# Altium footprint library LHAC-4XDSP2XV7-VP5_0226_3.PcbLib: 96 footprints (part 8 of 12) (continued)
## FFG1158 [mil] "FFG1158" (continued)
via -39.35,196.85 diameter 18 hole 10
via -157.45,196.85 diameter 18 hole 10
via -600.15,-1436.51 diameter 18 hole 10
via -600.15,-1475.87 diameter 18 hole 10
via -600.15,-1515.23 diameter 18 hole 10
via 324.81,-1200.35 diameter 18 hole 10
via 324.81,-1121.63 diameter 18 hole 10
via 324.81,-1160.99 diameter 18 hole 10
via 324.81,-1239.71 diameter 18 hole 10
via 324.81,-1436.51 diameter 18 hole 10
via 324.81,-1318.43 diameter 18 hole 10
via 324.81,-1357.79 diameter 18 hole 10
via 324.81,-1475.87 diameter 18 hole 10
via 324.81,-1397.15 diameter 18 hole 10
via 324.81,-1082.27 diameter 18 hole 10
via -314.95,-433.05 diameter 18 hole 10
via -508.46,-1723.26 diameter 18 hole 10
via -468.46,-1723.26 diameter 18 hole 10
via -157.45,-472.45 diameter 18 hole 10
via -78.75,-393.65 diameter 18 hole 10
via 0,-732.62 diameter 18 hole 10
via -157.55,-1101.91 diameter 18 hole 10
via -157.55,-1456.23 diameter 18 hole 10
via 157.5,-393.7 diameter 18 hole 10
via -118.05,236.15 diameter 18 hole 10
via -196.85,236.15 diameter 18 hole 10
via -39.35,314.95 diameter 18 hole 10
via -78.75,275.55 diameter 18 hole 10
via -78.75,157.45 diameter 18 hole 10
via -118.05,196.85 diameter 18 hole 10
via -78.75,314.95 diameter 18 hole 10
via -196.85,314.95 diameter 18 hole 10
via -78.75,236.15 diameter 18 hole 10
via -196.85,196.85 diameter 18 hole 10
via -275.55,-118.05 diameter 18 hole 10
via -275.6,-39.4 diameter 18 hole 10
via -236.15,-157.45 diameter 18 hole 10
via -236.15,-78.75 diameter 18 hole 10
via -236.15,39.35 diameter 18 hole 10
via -275.55,78.75 diameter 18 hole 10
via -236.15,118.05 diameter 18 hole 10
via -314.95,118.05 diameter 18 hole 10
via -314.95,-236.15 diameter 18 hole 10
via -275.55,-196.85 diameter 18 hole 10
via -275.6,-275.6 diameter 18 hole 10
via -236.15,-236.15 diameter 18 hole 10
via 118.05,118.05 diameter 18 hole 10
via 78.75,-118.05 diameter 18 hole 10
via 78.75,78.75 diameter 18 hole 10
via 39.4,39.4 diameter 18 hole 10
via -118.05,-118.05 diameter 18 hole 10
via -118.05,-39.35 diameter 18 hole 10
via -78.75,-78.75 diameter 18 hole 10
via 39.35,118.05 diameter 18 hole 10
via -78.75,39.35 diameter 18 hole 10
via -78.75,-157.45 diameter 18 hole 10
via 78.75,-39.35 diameter 18 hole 10
via -157.5,39.4 diameter 18 hole 10
via -39.35,78.75 diameter 18 hole 10
via -118.05,78.75 diameter 18 hole 10
via -196.85,78.75 diameter 18 hole 10
via -78.75,118.05 diameter 18 hole 10
via -157.45,118.05 diameter 18 hole 10
via 78.75,-275.55 diameter 18 hole 10
via 78.75,-196.85 diameter 18 hole 10
via -78.75,-236.15 diameter 18 hole 10
via -39.4,-275.6 diameter 18 hole 10
via 39.35,-236.15 diameter 18 hole 10
via -118.05,-275.55 diameter 18 hole 10
via -39.35,-196.85 diameter 18 hole 10
via -118.05,-196.85 diameter 18 hole 10
via 196.85,39.35 diameter 18 hole 10
via 275.6,39.4 diameter 18 hole 10
via 196.85,118.05 diameter 18 hole 10
via 314.95,78.75 diameter 18 hole 10
via 236.15,78.75 diameter 18 hole 10
via 275.55,-78.75 diameter 18 hole 10
via 275.6,-157.5 diameter 18 hole 10
via 196.85,-78.75 diameter 18 hole 10
via 236.15,-39.35 diameter 18 hole 10
via 196.85,-157.45 diameter 18 hole 10
via 236.15,-118.05 diameter 18 hole 10
via 275.55,118.05 diameter 18 hole 10
via 157.45,78.75 diameter 18 hole 10
via 236.15,-275.55 diameter 18 hole 10
via 275.55,-236.15 diameter 18 hole 10
via 196.85,-236.15 diameter 18 hole 10
via 314.95,-275.55 diameter 18 hole 10
via 236.15,-196.85 diameter 18 hole 10
via -629.85,472.45 diameter 18 hole 10
via 590.55,-78.75 diameter 18 hole 10
via 551.15,-78.75 diameter 18 hole 10
via -669.25,472.45 diameter 18 hole 10
via -629.85,551.15 diameter 18 hole 10
via 629.85,-196.85 diameter 18 hole 10
via 669.3,-39.4 diameter 18 hole 10
via 629.85,-118.05 diameter 18 hole 10
via 629.85,-39.35 diameter 18 hole 10
via 669.25,-196.85 diameter 18 hole 10
via 669.25,-118.05 diameter 18 hole 10
via -39.35,236.15 diameter 18 hole 10
via 78.75,354.25 diameter 18 hole 10
via -314.95,629.85 diameter 18 hole 10
via -354.25,669.25 diameter 18 hole 10
via 275.6,393.7 diameter 18 hole 10
via 118.05,590.55 diameter 18 hole 10
via 118.05,275.55 diameter 18 hole 10
via 118.05,157.45 diameter 18 hole 10
via 275.55,354.25 diameter 18 hole 10
via 157.5,275.6 diameter 18 hole 10
via -39.4,393.7 diameter 18 hole 10
via -314.95,590.55 diameter 18 hole 10
via 78.75,157.45 diameter 18 hole 10
via 39.35,236.15 diameter 18 hole 10
via 118.05,196.85 diameter 18 hole 10
via -39.35,590.55 diameter 18 hole 10
via 393.65,629.85 diameter 18 hole 10
via -78.75,433.05 diameter 18 hole 10
via -78.75,472.45 diameter 18 hole 10
via -196.85,393.65 diameter 18 hole 10
via -157.5,393.7 diameter 18 hole 10
via -354.25,590.55 diameter 18 hole 10
via -118.05,669.25 diameter 18 hole 10
via -196.85,669.25 diameter 18 hole 10
via -39.4,433.1 diameter 18 hole 10
via -236.15,629.85 diameter 18 hole 10
via -275.6,669.3 diameter 18 hole 10
via -157.5,669.3 diameter 18 hole 10
via -612.06,785.74 diameter 18 hole 10
via -629.85,511.75 diameter 18 hole 10
via -590.55,629.85 diameter 18 hole 10
via -629.85,669.25 diameter 18 hole 10
via -669.25,590.55 diameter 18 hole 10
via -669.25,511.75 diameter 18 hole 10
via -669.3,669.3 diameter 18 hole 10
via -669.25,196.85 diameter 18 hole 10
via -669.3,275.6 diameter 18 hole 10
via -669.3,433.1 diameter 18 hole 10
via -629.85,196.85 diameter 18 hole 10
via -590.55,472.45 diameter 18 hole 10
via -590.55,314.95 diameter 18 hole 10
via -629.85,354.25 diameter 18 hole 10
via -669.25,354.25 diameter 18 hole 10
via -590.55,-39.35 diameter 18 hole 10
via -669.25,118.05 diameter 18 hole 10
via -590.55,157.45 diameter 18 hole 10
via -629.85,39.35 diameter 18 hole 10
via -669.3,-157.5 diameter 18 hole 10
via -629.85,-157.45 diameter 18 hole 10
via -669.25,-78.75 diameter 18 hole 10
via -669.3,39.4 diameter 18 hole 10
via -590.55,-354.25 diameter 18 hole 10
via -669.25,-314.95 diameter 18 hole 10
via -669.25,-236.15 diameter 18 hole 10
via -590.55,-196.85 diameter 18 hole 10
via -629.85,-472.45 diameter 18 hole 10
via -669.3,-393.7 diameter 18 hole 10
via -669.25,-472.45 diameter 18 hole 10
via -590.55,-511.75 diameter 18 hole 10
via -629.85,-314.95 diameter 18 hole 10
via -669.25,-629.85 diameter 18 hole 10
via -590.55,-669.25 diameter 18 hole 10
via -629.85,-629.85 diameter 18 hole 10
via -669.3,-551.2 diameter 18 hole 10
via -238.46,785.74 diameter 18 hole 10
via -433.05,590.55 diameter 18 hole 10
via -472.45,669.25 diameter 18 hole 10
via -511.75,590.55 diameter 18 hole 10
via -433.1,551.2 diameter 18 hole 10
via -551.2,551.2 diameter 18 hole 10
via -275.55,590.55 diameter 18 hole 10
via -433.05,511.75 diameter 18 hole 10
via -433.1,669.3 diameter 18 hole 10
via -511.75,669.25 diameter 18 hole 10
via -433.05,629.85 diameter 18 hole 10
via -511.75,511.75 diameter 18 hole 10
via -393.7,551.2 diameter 18 hole 10
via -551.15,629.85 diameter 18 hole 10
via -433.05,314.95 diameter 18 hole 10
via -393.65,314.95 diameter 18 hole 10
via -551.15,472.45 diameter 18 hole 10
via -393.65,472.45 diameter 18 hole 10
via -511.75,275.55 diameter 18 hole 10
via -354.25,236.15 diameter 18 hole 10
via -354.25,354.25 diameter 18 hole 10
via -354.25,314.95 diameter 18 hole 10
via -393.7,393.7 diameter 18 hole 10
via -354.25,196.85 diameter 18 hole 10
via -354.25,472.45 diameter 18 hole 10
via -551.15,314.95 diameter 18 hole 10
via -433.1,393.7 diameter 18 hole 10
via -393.65,236.15 diameter 18 hole 10
via -433.05,236.15 diameter 18 hole 10
via -314.95,314.95 diameter 18 hole 10
via -511.75,433.05 diameter 18 hole 10
via -354.25,393.65 diameter 18 hole 10
via -354.25,275.55 diameter 18 hole 10
via -354.25,433.05 diameter 18 hole 10
via -551.15,236.15 diameter 18 hole 10
via -236.15,472.45 diameter 18 hole 10
via -551.2,393.7 diameter 18 hole 10
via -275.55,196.85 diameter 18 hole 10
via -511.75,354.25 diameter 18 hole 10
via -511.75,196.85 diameter 18 hole 10
via -511.75,118.05 diameter 18 hole 10
via -354.25,118.05 diameter 18 hole 10
via -393.7,157.5 diameter 18 hole 10
via -275.55,-78.75 diameter 18 hole 10
via -393.65,-118.05 diameter 18 hole 10
via -354.25,-157.45 diameter 18 hole 10
via -275.6,-157.5 diameter 18 hole 10
via -354.25,-118.05 diameter 18 hole 10
via -551.2,-39.4 diameter 18 hole 10
via -551.15,78.75 diameter 18 hole 10
via -511.75,-78.75 diameter 18 hole 10
via -433.05,78.75 diameter 18 hole 10
via -393.7,-39.4 diameter 18 hole 10
via -354.25,-39.35 diameter 18 hole 10
via -551.15,-118.05 diameter 18 hole 10
via -433.1,-39.4 diameter 18 hole 10
via -433.1,157.5 diameter 18 hole 10
via -354.25,157.45 diameter 18 hole 10
via -433.05,-118.05 diameter 18 hole 10
via -551.2,157.5 diameter 18 hole 10
via -511.75,-157.45 diameter 18 hole 10
via -511.75,39.35 diameter 18 hole 10
via -354.25,-78.75 diameter 18 hole 10
via -354.25,39.35 diameter 18 hole 10
via -393.65,78.75 diameter 18 hole 10
via -354.25,78.75 diameter 18 hole 10
via -236.15,-118.05 diameter 18 hole 10
via -275.6,39.4 diameter 18 hole 10
via -236.15,-39.35 diameter 18 hole 10
via -236.15,78.75 diameter 18 hole 10
via -354.25,-275.55 diameter 18 hole 10
via -236.15,-275.55 diameter 18 hole 10
via -551.15,-196.85 diameter 18 hole 10
via -196.85,-472.45 diameter 18 hole 10
via -314.95,-511.75 diameter 18 hole 10
via -433.1,-275.6 diameter 18 hole 10
via -354.25,-236.15 diameter 18 hole 10
via -393.7,-275.6 diameter 18 hole 10
via -551.2,-433.1 diameter 18 hole 10
via -551.15,-354.25 diameter 18 hole 10
via -511.75,-314.95 diameter 18 hole 10
via -511.75,-236.15 diameter 18 hole 10
via -551.2,-275.6 diameter 18 hole 10
via -314.95,-275.55 diameter 18 hole 10
via -393.65,-196.85 diameter 18 hole 10
via -236.15,-354.25 diameter 18 hole 10
via -511.75,-393.65 diameter 18 hole 10
via -433.05,-196.85 diameter 18 hole 10
via -236.15,-196.85 diameter 18 hole 10
via -354.25,-196.85 diameter 18 hole 10
via -511.75,-472.45 diameter 18 hole 10
via -551.15,-511.75 diameter 18 hole 10
via -433.05,-354.25 diameter 18 hole 10
via -433.1,-393.7 diameter 18 hole 10
via -393.65,-354.25 diameter 18 hole 10
via -433.05,-472.45 diameter 18 hole 10
via -393.7,-393.7 diameter 18 hole 10
via -354.25,-354.25 diameter 18 hole 10
via -354.25,-393.65 diameter 18 hole 10
via -393.7,-433.1 diameter 18 hole 10
via -354.25,-433.05 diameter 18 hole 10
via -433.1,-433.1 diameter 18 hole 10
via -354.25,-314.95 diameter 18 hole 10
via -433.05,-511.75 diameter 18 hole 10
via -433.1,-551.2 diameter 18 hole 10
via -551.2,-669.3 diameter 18 hole 10
via -551.15,-590.55 diameter 18 hole 10
via -511.75,-629.85 diameter 18 hole 10
via -433.05,-629.85 diameter 18 hole 10
via -511.75,-551.15 diameter 18 hole 10
via -393.7,-669.3 diameter 18 hole 10
via -433.1,-669.3 diameter 18 hole 10
via -275.55,-629.85 diameter 18 hole 10
via -433.05,-590.55 diameter 18 hole 10
via -502.15,-1121.63 diameter 18 hole 10
via -354.4,-1180.65 diameter 18 hole 10
via -315.03,-1180.65 diameter 18 hole 10
via -502.15,-1082.27 diameter 18 hole 10
via -502.15,-1042.91 diameter 18 hole 10
via -216.66,-1012.54 diameter 18 hole 10
via -275.66,-1220.02 diameter 18 hole 10
via -275.66,-1298.75 diameter 18 hole 10
via -275.66,-1338.12 diameter 18 hole 10
via -354.4,-1377.49 diameter 18 hole 10
via -236.29,-1298.75 diameter 18 hole 10
via -315.03,-1220.02 diameter 18 hole 10
via -315.03,-1298.75 diameter 18 hole 10
via -315.03,-1338.12 diameter 18 hole 10
via -315.03,-1377.49 diameter 18 hole 10
via -502.15,-1515.23 diameter 18 hole 10
via -502.15,-1436.51 diameter 18 hole 10
via -502.15,-1475.87 diameter 18 hole 10
via -216.66,-1545.5 diameter 18 hole 10
via -508.46,-1605.26 diameter 18 hole 10
via -468.46,-1605.26 diameter 18 hole 10
via -39.4,669.3 diameter 18 hole 10
via 39.4,551.2 diameter 18 hole 10
via -118.05,511.75 diameter 18 hole 10
via -157.45,629.85 diameter 18 hole 10
via 118.05,314.95 diameter 18 hole 10
via -157.45,236.15 diameter 18 hole 10
via -39.4,275.6 diameter 18 hole 10
via 78.75,433.05 diameter 18 hole 10
via -196.85,354.25 diameter 18 hole 10
via -78.75,393.65 diameter 18 hole 10
via -39.35,118.05 diameter 18 hole 10
via -196.85,-157.45 diameter 18 hole 10
via -118.05,39.35 diameter 18 hole 10
via 118.05,-118.05 diameter 18 hole 10
via -78.75,-118.05 diameter 18 hole 10
via -39.4,39.4 diameter 18 hole 10
via -157.5,-39.4 diameter 18 hole 10
via -196.85,-78.75 diameter 18 hole 10
via -118.05,-78.75 diameter 18 hole 10
via 78.75,39.35 diameter 18 hole 10
via 78.75,118.05 diameter 18 hole 10
via -118.05,118.05 diameter 18 hole 10
via 39.35,78.75 diameter 18 hole 10
via -157.45,78.75 diameter 18 hole 10
via -78.75,78.75 diameter 18 hole 10
via -157.45,-118.05 diameter 18 hole 10
via -78.75,-39.35 diameter 18 hole 10
via 39.4,157.5 diameter 18 hole 10
via 78.75,-157.45 diameter 18 hole 10
via -118.05,-157.45 diameter 18 hole 10
via 78.75,-78.75 diameter 18 hole 10
via -196.85,39.35 diameter 18 hole 10
via 118.05,78.75 diameter 18 hole 10
via 118.05,-39.35 diameter 18 hole 10
via -118.05,-314.95 diameter 18 hole 10
via -196.85,-236.15 diameter 18 hole 10
via -39.35,-236.15 diameter 18 hole 10
via -78.75,-196.85 diameter 18 hole 10
via 118.05,-511.75 diameter 18 hole 10
via 78.75,-236.15 diameter 18 hole 10
via 39.35,-196.85 diameter 18 hole 10
via 78.75,-393.65 diameter 18 hole 10
via -78.75,-433.05 diameter 18 hole 10
via -157.45,-196.85 diameter 18 hole 10
via -118.05,-236.15 diameter 18 hole 10
via 118.05,-275.55 diameter 18 hole 10
via 118.05,-196.85 diameter 18 hole 10
via -157.45,-590.55 diameter 18 hole 10
via 39.4,-669.3 diameter 18 hole 10
via -39.4,-551.2 diameter 18 hole 10
via 78.66,-1180.65 diameter 18 hole 10
via 39.29,-1180.65 diameter 18 hole 10
via -118.26,-979.36 diameter 18 hole 10
via -39.45,-1298.75 diameter 18 hole 10
via 78.66,-1377.49 diameter 18 hole 10
via 39.29,-1377.49 diameter 18 hole 10
via -0.08,-1220.02 diameter 18 hole 10
via 39.29,-1220.02 diameter 18 hole 10
via 39.29,-1298.75 diameter 18 hole 10
via -0.08,-1298.75 diameter 18 hole 10
via 39.29,-1338.12 diameter 18 hole 10
via -0.08,-1338.12 diameter 18 hole 10
via -157.55,-1298.75 diameter 18 hole 10
via -78.82,-1298.75 diameter 18 hole 10
via -196.92,-1298.75 diameter 18 hole 10
via -177.23,-1545.55 diameter 18 hole 10
via 433.05,629.85 diameter 18 hole 10
via 275.55,629.85 diameter 18 hole 10
via 157.45,590.55 diameter 18 hole 10
via 314.95,511.75 diameter 18 hole 10
via 433.05,590.55 diameter 18 hole 10
via 433.1,551.2 diameter 18 hole 10
via 433.05,511.75 diameter 18 hole 10
via 393.65,472.45 diameter 18 hole 10
via 393.7,669.3 diameter 18 hole 10
via 433.1,669.3 diameter 18 hole 10
via 354.25,236.15 diameter 18 hole 10
via 196.85,472.45 diameter 18 hole 10
via 236.15,354.25 diameter 18 hole 10
via 354.25,196.85 diameter 18 hole 10
via 354.25,354.25 diameter 18 hole 10
via 354.25,472.45 diameter 18 hole 10
via 393.65,314.95 diameter 18 hole 10
via 433.05,314.95 diameter 18 hole 10
via 393.7,393.7 diameter 18 hole 10
via 393.65,236.15 diameter 18 hole 10
via 433.05,236.15 diameter 18 hole 10
via 433.1,393.7 diameter 18 hole 10
via 354.25,433.05 diameter 18 hole 10
via 157.45,196.85 diameter 18 hole 10
via 433.05,472.45 diameter 18 hole 10
via 275.55,236.15 diameter 18 hole 10
via 354.25,275.55 diameter 18 hole 10
via 354.25,393.65 diameter 18 hole 10
via 354.25,314.95 diameter 18 hole 10
via 393.7,157.5 diameter 18 hole 10
via 433.1,157.5 diameter 18 hole 10
via 433.1,-39.4 diameter 18 hole 10
via 354.25,118.05 diameter 18 hole 10
via 196.85,-39.35 diameter 18 hole 10
via 157.5,39.4 diameter 18 hole 10
via 236.15,-157.45 diameter 18 hole 10
via 354.25,39.35 diameter 18 hole 10
via 157.5,-157.5 diameter 18 hole 10
via 354.25,-157.45 diameter 18 hole 10
via 275.55,78.75 diameter 18 hole 10
via 354.25,-78.75 diameter 18 hole 10
via 354.25,-118.05 diameter 18 hole 10
via 393.7,-39.4 diameter 18 hole 10
via 196.85,-118.05 diameter 18 hole 10
via 354.25,157.45 diameter 18 hole 10
via 236.15,39.35 diameter 18 hole 10
via 275.55,-118.05 diameter 18 hole 10
via 393.65,-118.05 diameter 18 hole 10
via 157.45,118.05 diameter 18 hole 10
via 393.65,78.75 diameter 18 hole 10
via 275.6,-39.4 diameter 18 hole 10
via 433.05,78.75 diameter 18 hole 10
via 433.05,-118.05 diameter 18 hole 10
via 196.85,78.75 diameter 18 hole 10
via 354.25,78.75 diameter 18 hole 10
via 354.25,-39.35 diameter 18 hole 10
via 157.45,-78.75 diameter 18 hole 10
via 236.15,-78.75 diameter 18 hole 10
via 314.95,-314.95 diameter 18 hole 10
via 196.85,-275.55 diameter 18 hole 10
via 433.05,-196.85 diameter 18 hole 10
via 354.25,-354.25 diameter 18 hole 10
via 196.85,-196.85 diameter 18 hole 10
via 236.15,-236.15 diameter 18 hole 10
via 354.25,-393.65 diameter 18 hole 10
via 354.25,-314.95 diameter 18 hole 10
via 354.25,-275.55 diameter 18 hole 10
via 275.6,-275.6 diameter 18 hole 10
via 196.85,-354.25 diameter 18 hole 10
via 354.25,-196.85 diameter 18 hole 10
via 275.55,-196.85 diameter 18 hole 10
via 314.95,-236.15 diameter 18 hole 10
via 393.7,-275.6 diameter 18 hole 10
via 433.1,-275.6 diameter 18 hole 10
via 354.25,-236.15 diameter 18 hole 10
via 393.65,-196.85 diameter 18 hole 10
via 157.45,-236.15 diameter 18 hole 10
via 354.25,-433.05 diameter 18 hole 10
via 236.15,-472.45 diameter 18 hole 10
via 393.65,-354.25 diameter 18 hole 10
via 433.1,-393.7 diameter 18 hole 10
via 393.7,-433.1 diameter 18 hole 10
via 433.05,-472.45 diameter 18 hole 10
via 433.05,-354.25 diameter 18 hole 10
via 433.05,-511.75 diameter 18 hole 10
via 433.1,-433.1 diameter 18 hole 10
via 157.45,-629.85 diameter 18 hole 10
via 433.1,-669.3 diameter 18 hole 10
via 433.05,-629.85 diameter 18 hole 10
via 393.7,-551.2 diameter 18 hole 10
via 433.05,-590.55 diameter 18 hole 10
via 433.1,-551.2 diameter 18 hole 10
via 275.55,-590.55 diameter 18 hole 10
via 422.81,-1200.35 diameter 18 hole 10
via 422.81,-1121.63 diameter 18 hole 10
via 422.81,-1160.99 diameter 18 hole 10
via 422.81,-1082.27 diameter 18 hole 10
via 422.81,-1239.71 diameter 18 hole 10
via 422.81,-1436.51 diameter 18 hole 10
via 422.81,-1357.79 diameter 18 hole 10
via 422.81,-1318.43 diameter 18 hole 10
via 422.81,-1475.87 diameter 18 hole 10
via 422.81,-1397.15 diameter 18 hole 10
via 551.2,551.2 diameter 18 hole 10
via 669.25,590.55 diameter 18 hole 10
via 472.45,669.25 diameter 18 hole 10
via 669.25,511.75 diameter 18 hole 10
via 511.75,669.25 diameter 18 hole 10
via 590.55,629.85 diameter 18 hole 10
via 629.85,511.75 diameter 18 hole 10
via 669.3,669.3 diameter 18 hole 10
via 511.75,590.55 diameter 18 hole 10
via 551.15,629.85 diameter 18 hole 10
via 511.75,511.75 diameter 18 hole 10
via 629.85,669.25 diameter 18 hole 10
via 629.85,354.25 diameter 18 hole 10
via 590.55,314.95 diameter 18 hole 10
via 551.15,314.95 diameter 18 hole 10
via 669.3,433.1 diameter 18 hole 10
via 669.25,354.25 diameter 18 hole 10
via 669.3,275.6 diameter 18 hole 10
via 511.75,275.55 diameter 18 hole 10
via 551.15,472.45 diameter 18 hole 10
via 629.85,196.85 diameter 18 hole 10
via 551.15,236.15 diameter 18 hole 10
via 511.75,196.85 diameter 18 hole 10
via 590.55,472.45 diameter 18 hole 10
via 511.75,433.05 diameter 18 hole 10
via 551.2,393.7 diameter 18 hole 10
via 511.75,354.25 diameter 18 hole 10
via 669.25,196.85 diameter 18 hole 10
via 629.85,39.35 diameter 18 hole 10
via 511.75,-157.45 diameter 18 hole 10
via 551.15,78.75 diameter 18 hole 10
via 669.3,39.4 diameter 18 hole 10
via 511.75,-78.75 diameter 18 hole 10
via 669.25,-78.75 diameter 18 hole 10
via 590.55,-39.35 diameter 18 hole 10
via 511.75,39.35 diameter 18 hole 10
via 551.2,157.5 diameter 18 hole 10
via 590.55,157.45 diameter 18 hole 10
via 511.75,118.05 diameter 18 hole 10
via 551.2,-39.4 diameter 18 hole 10
via 551.15,-118.05 diameter 18 hole 10
via 669.3,-157.5 diameter 18 hole 10
via 629.85,-157.45 diameter 18 hole 10
via 669.25,118.05 diameter 18 hole 10
via 551.15,-511.75 diameter 18 hole 10
via 551.15,-196.85 diameter 18 hole 10
via 590.55,-196.85 diameter 18 hole 10
via 511.75,-236.15 diameter 18 hole 10
via 590.55,-511.75 diameter 18 hole 10
via 669.25,-472.45 diameter 18 hole 10
via 590.55,-354.25 diameter 18 hole 10
via 511.75,-314.95 diameter 18 hole 10
via 551.2,-433.1 diameter 18 hole 10
via 669.3,-393.7 diameter 18 hole 10
via 511.75,-393.65 diameter 18 hole 10
via 551.15,-354.25 diameter 18 hole 10
via 669.25,-314.95 diameter 18 hole 10
via 669.25,-236.15 diameter 18 hole 10
via 629.85,-314.95 diameter 18 hole 10
via 629.85,-472.45 diameter 18 hole 10
via 511.75,-472.45 diameter 18 hole 10
via 590.55,-669.25 diameter 18 hole 10
via 669.3,-551.2 diameter 18 hole 10
via 551.15,-590.55 diameter 18 hole 10
via 511.75,-629.85 diameter 18 hole 10
via 511.75,-551.15 diameter 18 hole 10
via 669.25,-629.85 diameter 18 hole 10
via 551.2,-669.3 diameter 18 hole 10
via 629.85,-629.85 diameter 18 hole 10
Top Layer:
  lines w4: -669.3,157.5 -649.6,137.8 ; -669.3,393.7 -649.6,374 ; -669.3,551.2 -649.6,531.5 ; -669.25,78.75 -649.6,59.1 ; -669.25,236.15 -649.6,216.5 ; -669.25,314.95 -649.6,295.3 ; -669.25,472.45 -649.6,452.8 ; -669.25,629.85 -649.6,610.2 ; -629.85,78.75 -610.2,59.1 ; -629.85,157.45 -610.2,137.8 ; -629.85,236.15 -610.2,216.5 ; -629.85,314.95 -610.2,295.3 ; -629.85,393.65 -610.2,374 ; -629.85,472.45 -610.2,452.8 ; -629.85,551.15 -610.2,531.5 ; -629.85,629.85 -610.2,610.2 ; -590.55,-551.15 -570.9,-531.5 ; -590.55,-393.65 -570.9,-374 ; -590.55,-314.95 -570.9,-295.3 ; -590.55,-236.15 -570.9,-216.5 ; -590.55,-157.45 -570.9,-137.8 ; -590.55,39.35 -570.9,19.7 ; -590.55,118.05 -570.9,98.4 ; -590.55,196.85 -570.9,177.2 ; -590.55,275.55 -570.9,255.9 ; -590.55,354.25 -570.9,334.6 ; -590.55,433.05 -570.9,413.4 ; -590.55,669.25 -570.9,649.6 ; -551.2,-551.2 -531.5,-531.5 ; -551.2,-393.7 -531.5,-374 ; -551.2,-157.5 -531.5,-137.8 ; -551.2,39.4 -531.5,19.7 ; -551.2,275.6 -531.5,255.9 ; -551.2,433.1 -531.5,413.4 ; -551.2,669.3 -531.5,649.6 ; -551.15,-314.95 -531.5,-295.3 ; -551.15,-236.15 -531.5,-216.5 ; -551.15,118.05 -531.5,98.4 ; -551.15,196.85 -531.5,177.2 ; -551.15,354.25 -531.5,334.6 ; -511.75,-669.25 -492.1,-649.6 ; -511.75,-590.55 -492.1,-570.9 ; -511.75,-511.75 -492.1,-492.1 ; -511.75,-433.05 -492.1,-413.4 ; -511.75,-354.25 -492.1,-334.6 ; -511.75,-275.55 -492.1,-255.9 ; -511.75,-196.85 -492.1,-177.2 ; -511.75,-118.05 -492.1,-98.4 ; -511.75,-39.35 -492.1,-19.7 ; -511.75,78.75 -492.1,59.1 ; -511.75,157.45 -492.1,137.8 ; -511.75,236.15 -492.1,216.5 ; -511.75,314.95 -492.1,295.3 ; -511.75,393.65 -492.1,374 ; -511.75,472.45 -492.1,452.8 ; -472.45,-669.25 -452.8,-649.6 ; -472.45,-590.55 -452.8,-570.9 ; -472.45,-511.75 -452.8,-492.1 ; -472.45,-433.05 -452.8,-413.4 ; -472.45,-354.25 -452.8,-334.6 ; -472.45,-275.55 -452.8,-255.9 ; -472.45,-196.85 -452.8,-177.2 ; -472.45,-118.05 -452.8,-98.4 ; -472.45,-39.35 -452.8,-19.7 ; -472.45,78.75 -452.8,59.1 ; -472.45,157.45 -452.8,137.8 ; -472.45,314.95 -452.8,295.3 ; -472.45,393.65 -452.8,374 ; -472.45,472.45 -452.8,452.8 ; -433.1,433.1 -413.4,413.4 ; -433.05,-78.75 -413.4,-59.1 ; -433.05,118.05 -413.4,98.4 ; -433.05,354.25 -413.4,334.6 ; -393.7,-551.2 -374,-531.5 ; -393.65,-629.85 -374,-610.2 ; -393.65,-590.55 -374,-570.9 ; -393.65,-511.75 -374,-492.1 ; -393.65,-78.75 -374,-59.1 ; -393.65,118.05 -374,98.4 ; -393.65,354.25 -374,334.6 ; -354.25,-669.25 -334.6,-649.6 ; -354.25,-629.85 -334.6,-610.2 ; -354.25,-551.15 -334.6,-531.5 ; -354.25,-511.75 -334.6,-492.1 ; -354.25,-472.45 -334.6,-452.8 ; -314.95,-669.25 -295.3,-649.6 ; -314.95,-629.85 -295.3,-610.2 ; -314.95,-590.55 -295.3,-570.9 ; -314.95,-551.15 -295.3,-531.5 ; -314.95,-472.45 -295.3,-452.8 ; -314.95,-393.65 -295.3,-374 ; -314.95,-354.25 -295.3,-334.6 ; -314.95,-196.85 -295.3,-177.2 ; -314.95,-157.45 -295.3,-137.8 ; -314.95,-118.05 -295.3,-98.4 ; -314.95,-78.75 -295.3,-59.1 ; -314.95,-39.35 -295.3,-19.7 ; -314.95,39.35 -295.3,19.7 ; -314.95,78.75 -295.3,59.1 ; -314.95,433.05 -295.3,413.4 ; -314.95,472.45 -295.3,452.8 ; -275.6,-669.3 -255.9,-649.6 ; -275.6,-551.2 -255.9,-531.5 ; -275.6,-393.7 -255.9,-374 ; -275.55,-511.75 -255.9,-492.1 ; -275.55,-472.45 -255.9,-452.8 ; -275.55,-354.25 -255.9,-334.6 ; -275.55,-314.95 -255.9,-295.3 ; -275.55,118.05 -255.9,98.4 ; -236.15,-669.25 -216.5,-649.6 ; -236.15,-629.85 -216.5,-610.2 ; -236.15,-590.55 -216.5,-570.9 ; -236.15,-433.05 -216.5,-413.4 ; -236.15,-393.65 -216.5,-374 ; -236.15,-314.95 -216.5,-295.3 ; -236.15,511.75 -216.5,492.1 ; -196.85,-629.85 -177.2,-610.2 ; -196.85,-590.55 -177.2,-570.9 ; -196.85,-551.15 -177.2,-531.5 ; -196.85,-511.75 -177.2,-492.1 ; -196.85,-433.05 -177.2,-413.4 ; -196.85,-393.65 -177.2,-374 ; -196.85,-354.25 -177.2,-334.6 ; -196.85,-314.95 -177.2,-295.3 ; -196.85,118.05 -177.2,98.4 ; -196.85,393.65 -177.2,374 ; -157.5,-669.3 -137.8,-649.6 ; -157.5,-551.2 -137.8,-531.5 ; -157.5,-433.1 -137.8,-413.4 ; -157.5,-275.6 -137.8,-255.9 ; -157.5,393.7 -137.8,374 ; -157.45,-629.85 -137.8,-610.2 ; -157.45,-511.75 -137.8,-492.1 ; -157.45,-354.25 -137.8,-334.6 ; -157.45,-314.95 -137.8,-295.3 ; -157.45,472.45 -137.8,452.8 ; -118.05,-669.25 -98.4,-649.6 ; -118.05,-629.85 -98.4,-610.2 ; -118.05,-590.55 -98.4,-570.9 ; -118.05,-551.15 -98.4,-531.5 ; -118.05,-472.45 -98.4,-452.8 ; -118.05,-433.05 -98.4,-413.4 ; -118.05,-393.65 -98.4,-374 ; -118.05,-354.25 -98.4,-334.6 ; -118.05,433.05 -98.4,413.4 ; -118.05,472.45 -98.4,452.8 ; -78.75,-669.25 -59.1,-649.6 ; -78.75,-590.55 -59.1,-570.9 ; -78.75,-551.15 -59.1,-531.5 ; -78.75,-511.75 -59.1,-492.1 ; -78.75,-472.45 -59.1,-452.8 ; -78.75,-354.25 -59.1,-334.6 ; -78.75,-314.95 -59.1,-295.3 ; -78.75,-275.55 -59.1,-255.9 ; -39.4,-669.3 -19.7,-649.6 ; -39.4,-433.1 -19.7,-413.4 ; -39.4,-393.7 -19.7,-374 ; -39.4,-157.5 -19.7,-137.8 ; -39.4,-39.4 -19.7,-19.7 ; -39.4,157.5 -19.7,137.8 ; -39.35,-629.85 -19.7,-610.2 ; -39.35,-590.55 -19.7,-570.9 ; -39.35,-511.75 -19.7,-492.1 ; -39.35,-472.45 -19.7,-452.8 ; -39.35,-314.95 -19.7,-295.3 ; -39.35,-118.05 -19.7,-98.4 ; -39.35,-78.75 -19.7,-59.1 ; -39.35,354.25 -19.7,334.6 ; 19.7,-610.2 39.35,-629.85 ; 19.7,-570.9 39.35,-590.55 ; 19.7,-531.5 39.4,-551.2 ; 19.7,-492.1 39.35,-511.75 ; 19.7,-413.4 39.4,-433.1 ; 19.7,-374 39.4,-393.7 ; 19.7,-334.6 39.35,-354.25 ; 19.7,-295.3 39.35,-314.95 ; 19.7,-255.9 39.4,-275.6 ; 19.7,-137.8 39.4,-157.5 ; 19.7,-98.4 39.35,-118.05 ; 19.7,-59.1 39.35,-78.75 ; 19.7,-19.7 39.4,-39.4 ; 59.1,-649.6 78.75,-669.25 ; 59.1,-610.2 78.75,-629.85 ; 59.1,-531.5 78.75,-551.15 ; 59.1,-492.1 78.75,-511.75 ; 59.1,-452.8 78.75,-472.45 ; 59.1,-413.4 78.75,-433.05 ; 59.1,-334.6 78.75,-354.25 ; 59.1,-295.3 78.75,-314.95 ; 98.4,-649.6 118.05,-669.25 ; 98.4,-610.2 118.05,-629.85 ; 98.4,-570.9 118.05,-590.55 ; 98.4,-531.5 118.05,-551.15 ; 98.4,-452.8 118.05,-472.45 ; 98.4,-413.4 118.05,-433.05 ; 98.4,-374 118.05,-393.65 ; 98.4,-334.6 118.05,-354.25 ; 98.4,374 118.05,393.65 ; 98.4,413.4 118.05,433.05 ; 98.4,452.8 99.2,452.8 118.05,471.65 118.05,472.45 ; 137.8,-649.6 157.5,-669.3 ; 137.8,-570.9 157.45,-590.55 ; 137.8,-531.5 157.5,-551.2 ; 137.8,-492.1 157.45,-511.75 ; 137.8,-452.8 157.45,-472.45 ; 137.8,-295.3 157.45,-314.95 ; 137.8,137.8 157.5,157.5 ; 137.8,295.3 157.45,314.95 ; 137.8,452.8 157.45,472.45 ; 177.2,-649.6 196.85,-669.25 ; 177.2,-610.2 196.85,-629.85 ; 177.2,-570.9 196.85,-590.55 ; 177.2,-492.1 196.85,-511.75 ; 177.2,-452.8 196.85,-472.45 ; 177.2,-295.3 196.85,-314.95 ; 216.5,-610.2 236.15,-629.85 ; 216.5,-570.9 236.15,-590.55 ; 216.5,-531.5 236.15,-551.15 ; 216.5,-492.1 236.15,-511.75 ; 216.5,98.4 236.15,118.05 ; 255.9,-649.6 275.6,-669.3 ; 255.9,-610.2 275.55,-629.85 ; 255.9,-531.5 275.6,-551.2 ; 255.9,-492.1 275.55,-511.75 ; 255.9,334.6 275.55,354.25 ; 255.9,374 275.6,393.7 ; 255.9,570.9 275.55,590.55 ; 295.3,-649.6 314.95,-669.25 ; 295.3,-610.2 314.95,-629.85 ; 295.3,-570.9 314.95,-590.55 ; 295.3,-531.5 314.95,-551.15 ; 295.3,-452.8 314.95,-472.45 ; 295.3,-413.4 314.95,-433.05 ; 295.3,-177.2 314.95,-196.85 ; 295.3,-137.8 314.95,-157.45 ; 295.3,-98.4 314.95,-118.05 ; 295.3,-59.1 314.95,-78.75 ; 295.3,-19.7 314.95,-39.35 ; 295.3,19.7 314.95,39.35 ; 295.3,98.4 314.95,118.05 ; 334.6,-649.6 354.25,-669.25 ; 334.6,-570.9 354.25,-590.55 ; 334.6,-531.5 354.25,-551.15 ; 374,-649.6 393.7,-669.3 ; 374,-610.2 393.65,-629.85 ; 374,-570.9 393.65,-590.55 ; 374,-59.1 393.65,-78.75 ; 374,98.4 393.65,118.05 ; 413.4,-59.1 433.05,-78.75 ; 413.4,98.4 433.05,118.05 ; 413.4,413.4 433.1,433.1 ; 452.8,-649.6 472.45,-669.25 ; 452.8,-570.9 472.45,-590.55 ; 452.8,-492.1 472.45,-511.75 ; 452.8,-413.4 472.45,-433.05 ; 452.8,-334.6 472.45,-354.25 ; 452.8,-255.9 472.45,-275.55 ; 452.8,-177.2 472.45,-196.85 ; 452.8,-98.4 472.45,-118.05 ; 452.8,-19.7 472.45,-39.35 ; 452.8,59.1 472.45,78.75 ; 452.8,137.8 472.45,157.45 ; 452.8,216.5 472.45,236.15 ; 452.8,295.3 472.45,314.95 ; 452.8,374 472.45,393.65 ; 452.8,452.8 472.45,472.45 ; 492.1,-649.6 511.75,-669.25 ; 492.1,-570.9 511.75,-590.55 ; 492.1,-492.1 511.75,-511.75 ; 492.1,-413.4 511.75,-433.05 ; 492.1,-334.6 511.75,-354.25 ; 492.1,-255.9 511.75,-275.55 ; 492.1,-177.2 511.75,-196.85 ; 492.1,-98.4 511.75,-118.05 ; 492.1,-19.7 511.75,-39.35 ; 492.1,59.1 511.75,78.75 ; 492.1,137.8 511.75,157.45 ; 492.1,216.5 511.75,236.15 ; 492.1,295.3 511.75,314.95 ; 492.1,374 511.75,393.65 ; 492.1,452.8 511.75,472.45 ; 531.5,-531.5 551.2,-551.2 ; 531.5,-374 551.2,-393.7 ; 531.5,-295.3 551.15,-314.95 ; 531.5,-216.5 551.15,-236.15 ; 531.5,-137.8 551.2,-157.5 ; 531.5,-59.1 551.15,-78.75 ; 531.5,98.4 551.15,118.05 ; 531.5,255.9 551.2,275.6 ; 531.5,334.6 551.15,354.25 ; 531.5,413.4 551.2,433.1 ; 570.9,-531.5 590.55,-551.15 ; 570.9,-374 590.55,-393.65 ; 570.9,-295.3 590.55,-314.95 ; 570.9,-216.5 590.55,-236.15 ; 570.9,-137.8 590.55,-157.45 ; 570.9,-59.1 590.55,-78.75 ; 570.9,98.4 590.55,118.05 ; 570.9,255.9 590.55,275.55 ; 570.9,334.6 590.55,354.25 ; 570.9,413.4 590.55,433.05 ; 610.2,-177.2 629.85,-196.85 ; 610.2,-98.4 629.85,-118.05 ; 610.2,-19.7 629.85,-39.35 ; 610.2,216.5 629.85,236.15 ; 610.2,295.3 629.85,314.95 ; 610.2,374 629.85,393.65 ; 649.6,-177.2 669.25,-196.85 ; 649.6,-98.4 669.25,-118.05 ; 649.6,-19.7 669.3,-39.4 ; 649.6,216.5 669.25,236.15 ; 649.6,295.3 669.25,314.95 ; 649.6,374 669.3,393.7
  lines w5: -433.14,-1495.6 -413.46,-1475.92 ; -433.14,-1456.23 -413.46,-1436.55 ; -433.14,-1416.86 -413.46,-1397.18 ; -433.14,-1377.49 -413.46,-1357.81 ; -433.14,-1338.12 -413.46,-1318.44 ; -433.14,-1298.75 -413.46,-1279.07 ; -433.14,-1220.02 -413.46,-1239.7 ; -433.14,-1180.65 -413.46,-1200.33 ; -433.14,-1141.28 -413.46,-1160.96 ; -433.14,-1101.91 -413.46,-1121.59 ; -433.14,-1062.54 -413.46,-1082.22 ; -393.77,-1495.6 -374.09,-1475.92 ; -393.77,-1456.23 -374.09,-1436.55 ; -393.77,-1416.86 -374.09,-1397.18 ; -393.77,-1377.49 -374.09,-1357.81 ; -393.77,-1338.12 -374.09,-1318.44 ; -393.77,-1298.75 -374.09,-1279.07 ; -393.77,-1220.02 -374.09,-1239.7 ; -393.77,-1180.65 -374.09,-1200.33 ; -393.77,-1141.28 -374.09,-1160.96 ; -393.77,-1101.91 -374.09,-1121.59 ; -354.4,-1495.6 -334.72,-1475.92 ; -354.4,-1456.23 -334.72,-1436.55 ; -354.4,-1416.86 -334.72,-1397.18 ; -354.4,-1338.12 -334.72,-1318.44 ; -354.4,-1298.75 -334.72,-1279.07 ; -354.4,-1220.02 -334.72,-1239.7 ; -354.4,-1141.28 -334.72,-1160.96 ; -354.4,-1101.91 -334.72,-1121.59 ; -354.4,-1062.54 -334.72,-1082.22 ; -315.03,-1495.6 -295.35,-1475.92 ; -315.03,-1456.23 -295.35,-1436.55 ; -315.03,-1416.86 -295.35,-1397.18 ; -315.03,-1141.28 -295.35,-1160.96 ; -315.03,-1101.91 -295.35,-1121.59 ; -315.03,-1062.54 -295.35,-1082.22 ; -275.66,-1495.6 -255.98,-1475.92 ; -275.66,-1456.23 -255.98,-1436.55 ; -275.66,-1416.86 -255.98,-1397.18 ; -275.66,-1141.28 -255.98,-1160.96 ; -275.66,-1101.91 -255.98,-1121.59 ; -275.66,-1062.54 -255.98,-1082.22 ; -236.29,-1495.6 -216.61,-1475.92 ; -236.29,-1456.23 -216.61,-1436.55 ; -236.29,-1416.86 -216.61,-1397.18 ; -236.29,-1141.28 -216.61,-1160.96 ; -236.29,-1101.91 -216.61,-1121.59 ; -236.29,-1062.54 -216.61,-1082.22 ; -196.92,-1495.6 -177.24,-1475.92 ; -196.92,-1456.23 -177.24,-1436.55 ; -196.92,-1416.86 -177.24,-1397.18 ; -196.92,-1141.28 -177.24,-1160.96 ; -196.92,-1101.91 -177.24,-1121.59 ; -196.92,-1062.54 -177.24,-1082.22 ; -157.55,-1495.6 -137.87,-1475.92 ; -157.55,-1062.54 -137.87,-1082.22 ; -98.5,-1475.92 -78.82,-1495.6 ; -98.5,-1436.55 -78.82,-1456.23 ; -98.5,-1397.18 -78.82,-1416.86 ; -98.5,-1160.96 -78.82,-1141.28 ; -98.5,-1121.59 -78.82,-1101.91 ; -98.5,-1082.22 -78.82,-1062.54 ; -59.13,-1475.92 -39.45,-1495.6 ; -59.13,-1436.55 -39.45,-1456.23 ; -59.13,-1397.18 -39.45,-1416.86 ; -59.13,-1160.96 -39.45,-1141.28 ; -59.13,-1121.59 -39.45,-1101.91 ; -59.13,-1082.22 -39.45,-1062.54 ; -19.76,-1475.92 -0.08,-1495.6 ; -19.76,-1436.55 -0.08,-1456.23 ; -19.76,-1397.18 -0.08,-1416.86 ; -19.76,-1160.96 -0.08,-1141.28 ; -19.76,-1121.59 -0.08,-1101.91 ; -19.76,-1082.22 -0.08,-1062.54 ; 19.61,-1475.92 39.29,-1495.6 ; 19.61,-1436.55 39.29,-1456.23 ; 19.61,-1397.18 39.29,-1416.86 ; 19.61,-1160.96 39.29,-1141.28 ; 19.61,-1121.59 39.29,-1101.91 ; 19.61,-1082.22 39.29,-1062.54 ; 58.98,-1475.92 78.66,-1495.6 ; 58.98,-1436.55 78.66,-1456.23 ; 58.98,-1397.18 78.66,-1416.86 ; 58.98,-1318.44 78.66,-1338.12 ; 58.98,-1239.7 78.66,-1220.02 ; 58.98,-1160.96 78.66,-1141.28 ; 58.98,-1121.59 78.66,-1101.91 ; 58.98,-1082.22 78.66,-1062.54 ; 98.35,-1475.92 118.03,-1495.6 ; 98.35,-1436.55 118.03,-1456.23 ; 98.35,-1397.18 118.03,-1416.86 ; 98.35,-1357.81 118.03,-1377.49 ; 98.35,-1318.44 118.03,-1338.12 ; 98.35,-1279.07 118.03,-1298.75 ; 98.35,-1239.7 118.03,-1220.02 ; 98.35,-1200.33 118.03,-1180.65 ; 98.35,-1160.96 118.03,-1141.28 ; 98.35,-1121.59 118.03,-1101.91 ; 98.35,-1082.22 118.03,-1062.54 ; 137.72,-1318.44 157.4,-1338.12 ; 137.72,-1279.07 157.4,-1298.75 ; 137.72,-1239.7 157.4,-1220.02 ; 137.72,-1200.33 157.4,-1180.65 ; 137.72,-1160.96 157.4,-1141.28 ; 137.72,-1121.59 157.4,-1101.91
  lines w10: 216.5,570.9 236.15,590.55